# Altium footprint library Package_DFN_QFN.PcbLib: 557 footprints (part 24 of 35)
Each footprint in its own frame and in the unit in brackets; x right, y up, seen from the top. Pads: shape width x height; smd on the part's side, far side on the other; paste and mask are expansions set on the pad; w line width, h text height; cw(c..) or ccw(c..) is an arc to the next point about the centre after c.
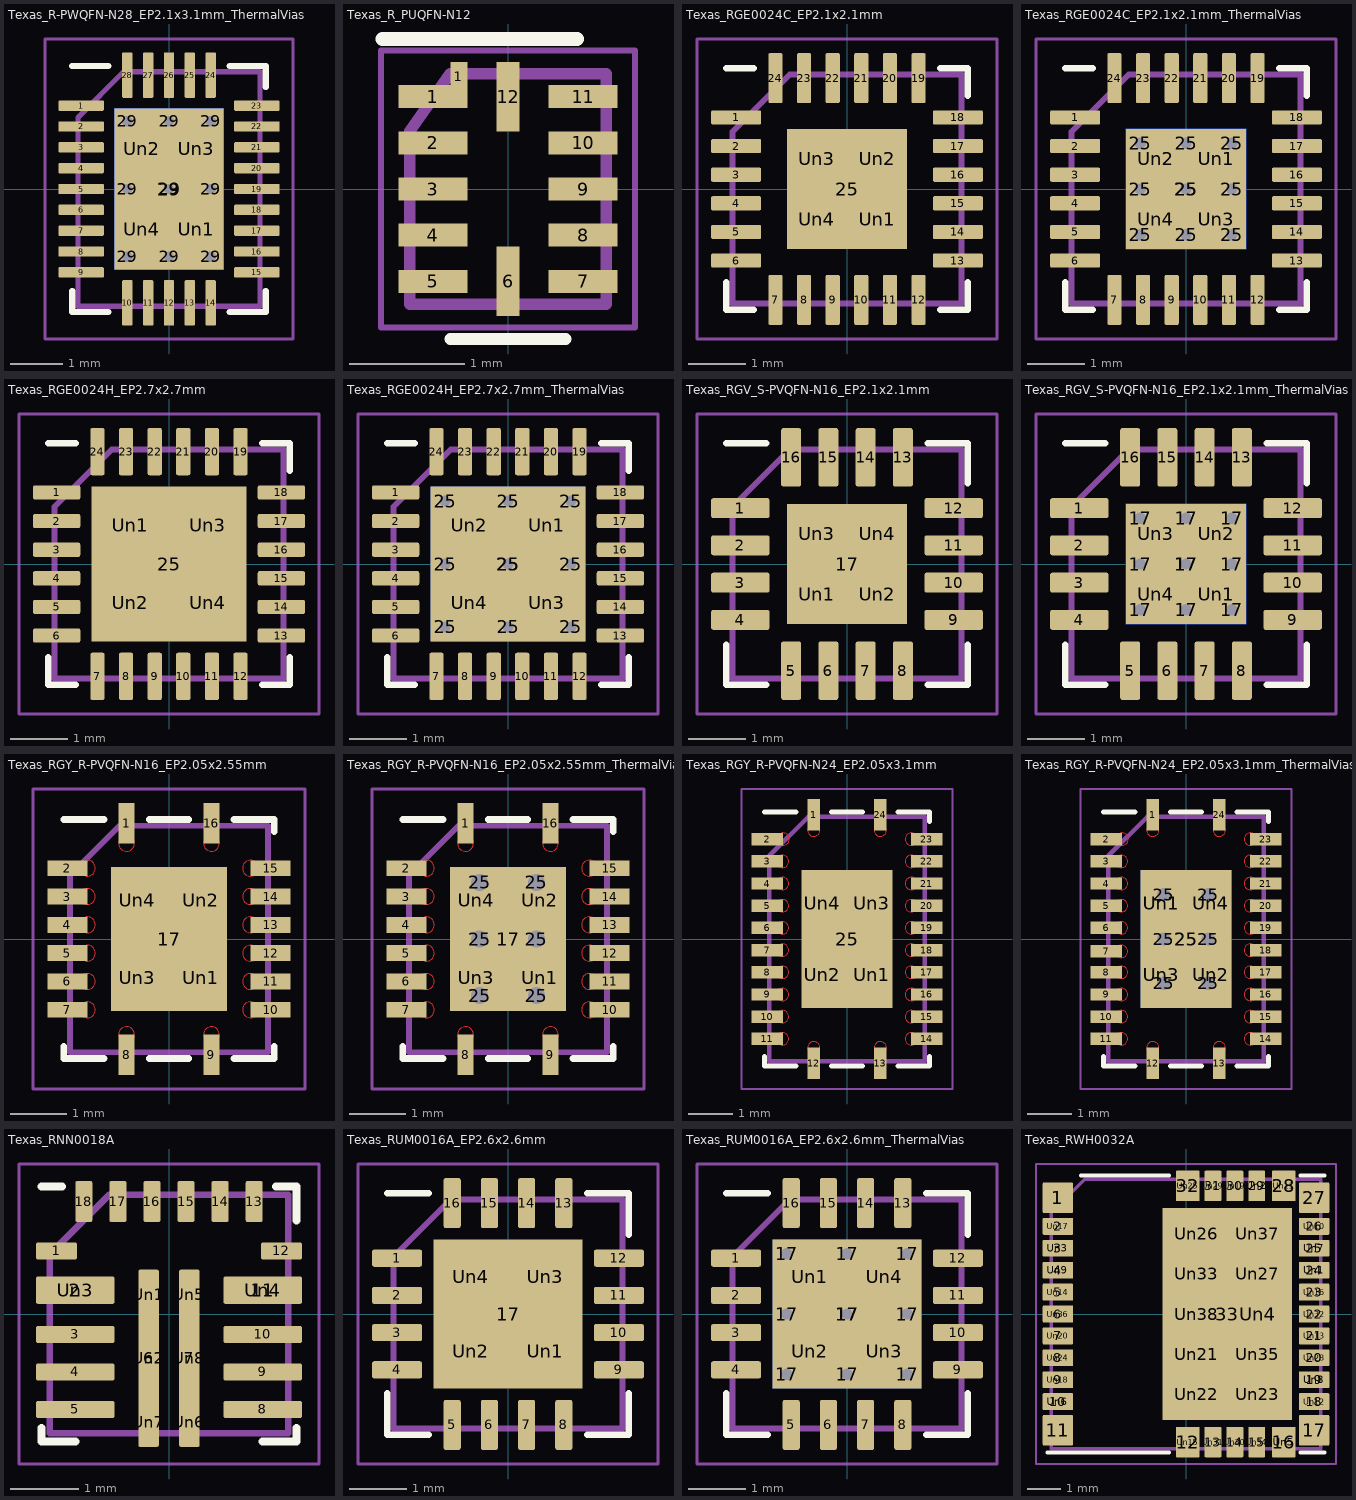
[diagram p23: the footprints below, top view; thin cyan lines are the x and y axes]

## Texas_R-PWQFN-N28_EP2.1x3.1mm_ThermalVias [mm]
pads (43):
  rrect25% 0.875x0.2 smd: 1(-1.687,1.6) 2(-1.687,1.2) 3(-1.687,0.8) 4(-1.687,0.4) 5(-1.687,0) 6(-1.687,-0.4) 7(-1.687,-0.8) 8(-1.687,-1.2) 9(-1.687,-1.6) 15(1.687,-1.6) 16(1.687,-1.2) 17(1.687,-0.8) 18(1.687,-0.4) 19(1.687,0) 20(1.687,0.4) 21(1.687,0.8) 22(1.687,1.2) 23(1.687,1.6)
  rrect25% 0.2x0.875 smd: 10(-0.8,-2.187) 11(-0.4,-2.187) 12(0,-2.187) 13(0.4,-2.187) 14(0.8,-2.187) 24(0.8,2.187) 25(0.4,2.187) 26(0,2.187) 27(-0.4,2.187) 28(-0.8,2.187)
  round 0.5 hole 0.2: 29(-0.8,-1.3) 29(-0.8,0) 29(-0.8,1.3) 29(0,-1.3) 29(0,0) 29(0,1.3) 29(0.8,-1.3) 29(0.8,0) 29(0.8,1.3)
  rect 2.1x3.1 smd: 29(0,0)
  rect 2.1x3.1 smd far side: 29(0,0)
  rrect25% 0.88x1.3 on Top Paste: Un1(0.525,-0.775) Un2(-0.525,0.775) Un3(0.525,0.775) Un4(-0.525,-0.775)
F.SilkS:
  lines w0.12: -1.86,-1.96 -1.86,-2.36 -1.16,-2.36 ; -1.86,2.36 -1.16,2.36 ; 1.16,-2.36 1.86,-2.36 1.86,-1.96 ; 1.16,2.36 1.86,2.36 1.86,1.96
F.CrtYd:
  lines w0.05: -2.38,-2.88 2.38,-2.88 2.38,2.88 -2.38,2.88 -2.38,-2.88
F.Fab:
  lines w0.1: -1.75,-2.25 1.75,-2.25 1.75,2.25 -0.875,2.25 -1.75,1.375 -1.75,-2.25
  text "'.Designator'" at -3.559,-0.737 h0.88

## Texas_R_PUQFN-N12 [mm]
pads (13):
  rect 0.6x0.2 smd: 1(-0.65,0.8) 2(-0.65,0.4) 3(-0.65,0) 4(-0.65,-0.4) 5(-0.65,-0.8) 7(0.65,-0.8) 8(0.65,-0.4) 9(0.65,0) 10(0.65,0.4) 11(0.65,0.8)
  rect 0.15x0.25 smd: 1(-0.425,0.975)
  rect 0.2x0.6 smd: 6(0,-0.8) 12(0,0.8)
F.SilkS:
  lines w0.1: -0.5,-1.3 0.5,-1.3
  lines w0.12: -1.09,1.3 0.6,1.3
F.CrtYd:
  lines w0.05: -1.1,-1.2 -1.1,1.2 1.1,1.2 1.1,-1.2 -1.1,-1.2
F.Fab:
  lines w0.1: -0.85,-1 0.85,-1 0.85,1 -0.5,1 -0.85,0.5 -0.85,-1
  text "'.Designator'" at -1.199,-0.237 h0.3

## Texas_RGE0024C_EP2.1x2.1mm [mm]
pads (29):
  rrect25% 0.875x0.25 smd: 1(-1.937,1.25) 2(-1.937,0.75) 3(-1.937,0.25) 4(-1.937,-0.25) 5(-1.937,-0.75) 6(-1.937,-1.25) 13(1.937,-1.25) 14(1.937,-0.75) 15(1.937,-0.25) 16(1.937,0.25) 17(1.937,0.75) 18(1.937,1.25)
  rrect25% 0.25x0.875 smd: 7(-1.25,-1.937) 8(-0.75,-1.937) 9(-0.25,-1.937) 10(0.25,-1.937) 11(0.75,-1.937) 12(1.25,-1.937) 19(1.25,1.937) 20(0.75,1.937) 21(0.25,1.937) 22(-0.25,1.937) 23(-0.75,1.937) 24(-1.25,1.937)
  rect 2.1x2.1 smd: 25(0,0)
  rrect25% 0.85x0.85 on Top Paste: Un1(0.525,-0.525) Un2(0.525,0.525) Un3(-0.525,0.525) Un4(-0.525,-0.525)
F.SilkS:
  lines w0.12: -2.11,-1.635 -2.11,-2.11 -1.635,-2.11 ; -2.11,2.11 -1.635,2.11 ; 1.635,-2.11 2.11,-2.11 2.11,-1.635 ; 1.635,2.11 2.11,2.11 2.11,1.635
F.CrtYd:
  lines w0.05: -2.62,-2.62 2.62,-2.62 2.62,2.62 -2.62,2.62 -2.62,-2.62
F.Fab:
  lines w0.1: -2,-2 -2,1 -1,2 2,2 2,-2 -2,-2
  text "'.Designator'" at -4.047,-0.84 h1

## Texas_RGE0024C_EP2.1x2.1mm_ThermalVias [mm]
pads (39):
  rrect25% 0.875x0.25 smd: 1(-1.937,1.25) 2(-1.937,0.75) 3(-1.937,0.25) 4(-1.937,-0.25) 5(-1.937,-0.75) 6(-1.937,-1.25) 13(1.937,-1.25) 14(1.937,-0.75) 15(1.937,-0.25) 16(1.937,0.25) 17(1.937,0.75) 18(1.937,1.25)
  rrect25% 0.25x0.875 smd: 7(-1.25,-1.937) 8(-0.75,-1.937) 9(-0.25,-1.937) 10(0.25,-1.937) 11(0.75,-1.937) 12(1.25,-1.937) 19(1.25,1.937) 20(0.75,1.937) 21(0.25,1.937) 22(-0.25,1.937) 23(-0.75,1.937) 24(-1.25,1.937)
  round 0.5 hole 0.2: 25(-0.8,-0.8) 25(-0.8,0) 25(-0.8,0.8) 25(0,-0.8) 25(0,0) 25(0,0.8) 25(0.8,-0.8) 25(0.8,0) 25(0.8,0.8)
  rect 2.1x2.1 smd far side: 25(0,0)
  rect 2.1x2.1 smd: 25(0,0)
  rrect25% 0.85x0.85 on Top Paste: Un1(0.525,0.525) Un2(-0.525,0.525) Un3(0.525,-0.525) Un4(-0.525,-0.525)
F.SilkS:
  lines w0.12: -2.11,-1.635 -2.11,-2.11 -1.635,-2.11 ; -2.11,2.11 -1.635,2.11 ; 1.635,-2.11 2.11,-2.11 2.11,-1.635 ; 1.635,2.11 2.11,2.11 2.11,1.635
F.CrtYd:
  lines w0.05: -2.62,-2.62 -2.62,2.62 2.62,2.62 2.62,-2.62 -2.62,-2.62
F.Fab:
  lines w0.1: -2,-2 -2,1 -1,2 2,2 2,-2 -2,-2
  text "'.Designator'" at -4.047,-0.84 h1

## Texas_RGE0024H_EP2.7x2.7mm [mm]
pads (29):
  rrect25% 0.825x0.25 smd: 1(-1.963,1.25) 2(-1.963,0.75) 3(-1.963,0.25) 4(-1.963,-0.25) 5(-1.963,-0.75) 6(-1.963,-1.25) 13(1.963,-1.25) 14(1.963,-0.75) 15(1.963,-0.25) 16(1.963,0.25) 17(1.963,0.75) 18(1.963,1.25)
  rrect25% 0.25x0.825 smd: 7(-1.25,-1.963) 8(-0.75,-1.963) 9(-0.25,-1.963) 10(0.25,-1.963) 11(0.75,-1.963) 12(1.25,-1.963) 19(1.25,1.963) 20(0.75,1.963) 21(0.25,1.963) 22(-0.25,1.963) 23(-0.75,1.963) 24(-1.25,1.963)
  rect 2.7x2.7 smd: 25(0,0)
  rrect23% 1.09x1.09 on Top Paste: Un1(-0.675,0.675) Un2(-0.675,-0.675) Un3(0.675,0.675) Un4(0.675,-0.675)
F.SilkS:
  lines w0.12: -2.11,-1.635 -2.11,-2.11 -1.635,-2.11 ; -2.11,2.11 -1.635,2.11 ; 1.635,-2.11 2.11,-2.11 2.11,-1.635 ; 1.635,2.11 2.11,2.11 2.11,1.635
F.CrtYd:
  lines w0.05: -2.62,-2.62 -2.62,2.62 2.62,2.62 2.62,-2.62 -2.62,-2.62
F.Fab:
  lines w0.1: -2,-2 2,-2 2,2 -1,2 -2,1 -2,-2
  text "'.Designator'" at -4.047,-0.84 h1

## Texas_RGE0024H_EP2.7x2.7mm_ThermalVias [mm]
pads (39):
  rrect25% 0.825x0.25 smd: 1(-1.963,1.25) 2(-1.963,0.75) 3(-1.963,0.25) 4(-1.963,-0.25) 5(-1.963,-0.75) 6(-1.963,-1.25) 13(1.963,-1.25) 14(1.963,-0.75) 15(1.963,-0.25) 16(1.963,0.25) 17(1.963,0.75) 18(1.963,1.25)
  rrect25% 0.25x0.825 smd: 7(-1.25,-1.963) 8(-0.75,-1.963) 9(-0.25,-1.963) 10(0.25,-1.963) 11(0.75,-1.963) 12(1.25,-1.963) 19(1.25,1.963) 20(0.75,1.963) 21(0.25,1.963) 22(-0.25,1.963) 23(-0.75,1.963) 24(-1.25,1.963)
  round 0.5 hole 0.2: 25(-1.1,-1.1) 25(-1.1,0) 25(-1.1,1.1) 25(0,-1.1) 25(0,0) 25(0,1.1) 25(1.1,-1.1) 25(1.1,0) 25(1.1,1.1)
  rect 2.7x2.7 smd far side: 25(0,0)
  rect 2.7x2.7 smd: 25(0,0)
  rrect21% 1.17x1.17 on Top Paste: Un1(0.675,0.675) Un2(-0.675,0.675) Un3(0.675,-0.675) Un4(-0.675,-0.675)
F.SilkS:
  lines w0.12: -2.11,-1.635 -2.11,-2.11 -1.635,-2.11 ; -2.11,2.11 -1.635,2.11 ; 1.635,-2.11 2.11,-2.11 2.11,-1.635 ; 1.635,2.11 2.11,2.11 2.11,1.635
F.CrtYd:
  lines w0.05: -2.62,-2.62 2.62,-2.62 2.62,2.62 -2.62,2.62 -2.62,-2.62
F.Fab:
  lines w0.1: -2,-2 2,-2 2,2 -1,2 -2,1 -2,-2
  text "'.Designator'" at -4.047,-0.84 h1

## Texas_RGV_S-PVQFN-N16_EP2.1x2.1mm [mm]
pads (21):
  rrect25% 1.025x0.35 smd: 1(-1.863,0.975) 2(-1.863,0.325) 3(-1.863,-0.325) 4(-1.863,-0.975) 9(1.863,-0.975) 10(1.863,-0.325) 11(1.863,0.325) 12(1.863,0.975)
  rrect25% 0.35x1.025 smd: 5(-0.975,-1.863) 6(-0.325,-1.863) 7(0.325,-1.863) 8(0.975,-1.863) 13(0.975,1.863) 14(0.325,1.863) 15(-0.325,1.863) 16(-0.975,1.863)
  rect 2.1x2.1 smd: 17(0,0)
  rrect25% 0.85x0.85 on Top Paste: Un1(-0.525,-0.525) Un2(0.525,-0.525) Un3(-0.525,0.525) Un4(0.525,0.525)
F.SilkS:
  lines w0.12: -2.11,-1.41 -2.11,-2.11 -1.41,-2.11 ; -2.11,2.11 -1.41,2.11 ; 1.41,-2.11 2.11,-2.11 2.11,-1.41 ; 1.41,2.11 2.11,2.11 2.11,1.41
F.CrtYd:
  lines w0.05: -2.62,-2.62 -2.62,2.62 2.62,2.62 2.62,-2.62 -2.62,-2.62
F.Fab:
  lines w0.1: -2,-2 2,-2 2,2 -1,2 -2,1 -2,-2
  text "'.Designator'" at -4.047,-0.84 h1

## Texas_RGV_S-PVQFN-N16_EP2.1x2.1mm_ThermalVias [mm]
pads (31):
  rrect25% 1.025x0.35 smd: 1(-1.863,0.975) 2(-1.863,0.325) 3(-1.863,-0.325) 4(-1.863,-0.975) 9(1.863,-0.975) 10(1.863,-0.325) 11(1.863,0.325) 12(1.863,0.975)
  rrect25% 0.35x1.025 smd: 5(-0.975,-1.863) 6(-0.325,-1.863) 7(0.325,-1.863) 8(0.975,-1.863) 13(0.975,1.863) 14(0.325,1.863) 15(-0.325,1.863) 16(-0.975,1.863)
  round 0.5 hole 0.2: 17(-0.8,-0.8) 17(-0.8,0) 17(-0.8,0.8) 17(0,-0.8) 17(0,0) 17(0,0.8) 17(0.8,-0.8) 17(0.8,0) 17(0.8,0.8)
  rect 2.1x2.1 smd: 17(0,0)
  rect 2.1x2.1 smd far side: 17(0,0)
  rrect25% 0.91x0.91 on Top Paste: Un1(0.525,-0.525) Un2(0.525,0.525) Un3(-0.525,0.525) Un4(-0.525,-0.525)
F.SilkS:
  lines w0.12: -2.11,-1.41 -2.11,-2.11 -1.41,-2.11 ; -2.11,2.11 -1.41,2.11 ; 1.41,-2.11 2.11,-2.11 2.11,-1.41 ; 1.41,2.11 2.11,2.11 2.11,1.41
F.CrtYd:
  lines w0.05: -2.62,-2.62 -2.62,2.62 2.62,2.62 2.62,-2.62 -2.62,-2.62
F.Fab:
  lines w0.1: -2,-2 -2,1 -1,2 2,2 2,-2 -2,-2
  text "'.Designator'" at -4.047,-0.84 h1

## Texas_RGY_R-PVQFN-N16_EP2.05x2.55mm [mm]
pads (21):
  rect 0.28x0.71 smd: 1(-0.75,2.045) 8(-0.75,-2.045) 9(0.75,-2.045) 16(0.75,2.045)
  rect 0.71x0.28 smd: 2(-1.795,1.25) 3(-1.795,0.75) 4(-1.795,0.25) 5(-1.795,-0.25) 6(-1.795,-0.75) 7(-1.795,-1.25) 10(1.795,-1.25) 11(1.795,-0.75) 12(1.795,-0.25) 13(1.795,0.25) 14(1.795,0.75) 15(1.795,1.25)
  rect 2.05x2.55 smd: 17(0,0)
  rect 0.82x1.07 on Top Paste: Un1(0.56,-0.685) Un2(0.56,0.685) Un3(-0.56,-0.685) Un4(-0.56,0.685)
F.Cu:
  circle w0: c-0.75,1.69 r0.14
  circle w0: c-1.44,1.25 r0.14
  circle w0: c-1.44,0.75 r0.14
  circle w0: c-1.44,0.25 r0.14
  circle w0: c-1.44,-0.25 r0.14
  circle w0: c-1.44,-0.75 r0.14
  circle w0: c-1.44,-1.25 r0.14
  circle w0: c-0.75,-1.69 r0.14
  circle w0: c0.75,-1.69 r0.14
  circle w0: c1.44,-1.25 r0.14
  circle w0: c1.44,-0.75 r0.14
  circle w0: c1.44,-0.25 r0.14
  circle w0: c1.44,0.25 r0.14
  circle w0: c1.44,0.75 r0.14
  circle w0: c1.44,1.25 r0.14
  circle w0: c0.75,1.69 r0.14
F.SilkS:
  lines w0.12: -1.86,-1.9 -1.86,-2.11 -1.15,-2.11 ; -1.86,2.11 -1.15,2.11 ; -0.35,-2.11 0.35,-2.11 ; -0.35,2.11 0.35,2.11 ; 1.15,-2.11 1.86,-2.11 1.86,-1.9 ; 1.15,2.11 1.86,2.11 1.86,1.9
F.Paste:
  circle w0: c-0.75,1.69 r0.14
  circle w0: c-1.44,1.25 r0.14
  circle w0: c-1.44,0.75 r0.14
  circle w0: c-1.44,0.25 r0.14
  circle w0: c-1.44,-0.25 r0.14
  circle w0: c-1.44,-0.75 r0.14
  circle w0: c-1.44,-1.25 r0.14
  circle w0: c-0.75,-1.69 r0.14
  circle w0: c0.75,-1.69 r0.14
  circle w0: c1.44,-1.25 r0.14
  circle w0: c1.44,-0.75 r0.14
  circle w0: c1.44,-0.25 r0.14
  circle w0: c1.44,0.25 r0.14
  circle w0: c1.44,0.75 r0.14
  circle w0: c1.44,1.25 r0.14
  circle w0: c0.75,1.69 r0.14
F.Mask:
  circle w0: c-0.75,1.69 r0.14
  circle w0: c-1.44,1.25 r0.14
  circle w0: c-1.44,0.75 r0.14
  circle w0: c-1.44,0.25 r0.14
  circle w0: c-1.44,-0.25 r0.14
  circle w0: c-1.44,-0.75 r0.14
  circle w0: c-1.44,-1.25 r0.14
  circle w0: c-0.75,-1.69 r0.14
  circle w0: c0.75,-1.69 r0.14
  circle w0: c1.44,-1.25 r0.14
  circle w0: c1.44,-0.75 r0.14
  circle w0: c1.44,-0.25 r0.14
  circle w0: c1.44,0.25 r0.14
  circle w0: c1.44,0.75 r0.14
  circle w0: c1.44,1.25 r0.14
  circle w0: c0.75,1.69 r0.14
F.CrtYd:
  lines w0.05: -2.4,-2.65 2.4,-2.65 2.4,2.65 -2.4,2.65 -2.4,-2.65
F.Fab:
  lines w0.1: -1.75,-2 -1.75,1.125 -0.875,2 1.75,2 1.75,-2 -1.75,-2
  text "'.Designator'" at -3.559,-0.737 h0.88

## Texas_RGY_R-PVQFN-N16_EP2.05x2.55mm_ThermalVias [mm]
pads (27):
  rect 0.28x0.71 smd: 1(-0.75,2.045) 8(-0.75,-2.045) 9(0.75,-2.045) 16(0.75,2.045)
  rect 0.71x0.28 smd: 2(-1.795,1.25) 3(-1.795,0.75) 4(-1.795,0.25) 5(-1.795,-0.25) 6(-1.795,-0.75) 7(-1.795,-1.25) 10(1.795,-1.25) 11(1.795,-0.75) 12(1.795,-0.25) 13(1.795,0.25) 14(1.795,0.75) 15(1.795,1.25)
  rect 2.05x2.55 smd: 17(0,0)
  round 0.5 hole 0.3: 25(-0.5,-1) 25(-0.5,0) 25(-0.5,1) 25(0.5,-1) 25(0.5,0) 25(0.5,1)
  rect 0.82x1.07 on Top Paste: Un1(0.56,-0.685) Un2(0.56,0.685) Un3(-0.56,-0.685) Un4(-0.56,0.685)
F.Cu:
  circle w0: c-0.75,1.69 r0.14
  circle w0: c-1.44,1.25 r0.14
  circle w0: c-1.44,0.75 r0.14
  circle w0: c-1.44,0.25 r0.14
  circle w0: c-1.44,-0.25 r0.14
  circle w0: c-1.44,-0.75 r0.14
  circle w0: c-1.44,-1.25 r0.14
  circle w0: c-0.75,-1.69 r0.14
  circle w0: c0.75,-1.69 r0.14
  circle w0: c1.44,-1.25 r0.14
  circle w0: c1.44,-0.75 r0.14
  circle w0: c1.44,-0.25 r0.14
  circle w0: c1.44,0.25 r0.14
  circle w0: c1.44,0.75 r0.14
  circle w0: c1.44,1.25 r0.14
  circle w0: c0.75,1.69 r0.14
F.SilkS:
  lines w0.12: -1.86,-1.9 -1.86,-2.11 -1.15,-2.11 ; -1.86,2.11 -1.15,2.11 ; -0.35,-2.11 0.35,-2.11 ; -0.35,2.11 0.35,2.11 ; 1.15,-2.11 1.86,-2.11 1.86,-1.9 ; 1.15,2.11 1.86,2.11 1.86,1.9
F.Paste:
  circle w0: c-0.75,1.69 r0.14
  circle w0: c-1.44,1.25 r0.14
  circle w0: c-1.44,0.75 r0.14
  circle w0: c-1.44,0.25 r0.14
  circle w0: c-1.44,-0.25 r0.14
  circle w0: c-1.44,-0.75 r0.14
  circle w0: c-1.44,-1.25 r0.14
  circle w0: c-0.75,-1.69 r0.14
  circle w0: c0.75,-1.69 r0.14
  circle w0: c1.44,-1.25 r0.14
  circle w0: c1.44,-0.75 r0.14
  circle w0: c1.44,-0.25 r0.14
  circle w0: c1.44,0.25 r0.14
  circle w0: c1.44,0.75 r0.14
  circle w0: c1.44,1.25 r0.14
  circle w0: c0.75,1.69 r0.14
F.Mask:
  circle w0: c-0.75,1.69 r0.14
  circle w0: c-1.44,1.25 r0.14
  circle w0: c-1.44,0.75 r0.14
  circle w0: c-1.44,0.25 r0.14
  circle w0: c-1.44,-0.25 r0.14
  circle w0: c-1.44,-0.75 r0.14
  circle w0: c-1.44,-1.25 r0.14
  circle w0: c-0.75,-1.69 r0.14
  circle w0: c0.75,-1.69 r0.14
  circle w0: c1.44,-1.25 r0.14
  circle w0: c1.44,-0.75 r0.14
  circle w0: c1.44,-0.25 r0.14
  circle w0: c1.44,0.25 r0.14
  circle w0: c1.44,0.75 r0.14
  circle w0: c1.44,1.25 r0.14
  circle w0: c0.75,1.69 r0.14
F.CrtYd:
  lines w0.05: -2.4,-2.65 2.4,-2.65 2.4,2.65 -2.4,2.65 -2.4,-2.65
F.Fab:
  lines w0.1: -1.75,-2 -1.75,1.125 -0.875,2 1.75,2 1.75,-2 -1.75,-2
  text "'.Designator'" at -3.559,-0.737 h0.88

## Texas_RGY_R-PVQFN-N24_EP2.05x3.1mm [mm]
pads (29):
  rect 0.28x0.71 smd: 1(-0.75,2.795) 12(-0.75,-2.795) 13(0.75,-2.795) 24(0.75,2.795)
  rect 0.71x0.28 smd: 2(-1.795,2.25) 3(-1.795,1.75) 4(-1.795,1.25) 5(-1.795,0.75) 6(-1.795,0.25) 7(-1.795,-0.25) 8(-1.795,-0.75) 9(-1.795,-1.25) 10(-1.795,-1.75) 11(-1.795,-2.25) 14(1.795,-2.25) 15(1.795,-1.75) 16(1.795,-1.25) 17(1.795,-0.75) 18(1.795,-0.25) 19(1.795,0.25) 20(1.795,0.75) 21(1.795,1.25) 22(1.795,1.75) 23(1.795,2.25)
  rect 2.05x3.1 smd: 25(0,0)
  rect 0.82x1.32 on Top Paste: Un1(0.56,-0.81) Un2(-0.56,-0.81) Un3(0.56,0.81) Un4(-0.56,0.81)
F.Cu:
  circle w0: c-0.75,2.452 r0.14
  circle w0: c-1.44,2.25 r0.14
  circle w0: c-1.452,1.75 r0.14
  circle w0: c-1.452,1.25 r0.14
  circle w0: c-1.452,0.75 r0.14
  circle w0: c-1.452,0.25 r0.14
  circle w0: c-1.452,-0.25 r0.14
  circle w0: c-1.452,-0.75 r0.14
  circle w0: c-1.452,-1.25 r0.14
  circle w0: c-1.452,-1.75 r0.14
  circle w0: c-1.452,-2.25 r0.14
  circle w0: c-0.75,-2.452 r0.14
  circle w0: c0.75,-2.452 r0.14
  circle w0: c1.452,-2.25 r0.14
  circle w0: c1.452,-1.75 r0.14
  circle w0: c1.452,-1.25 r0.14
  circle w0: c1.452,-0.75 r0.14
  circle w0: c1.452,-0.25 r0.14
  circle w0: c1.452,0.25 r0.14
  circle w0: c1.452,0.75 r0.14
  circle w0: c1.452,1.25 r0.14
  circle w0: c1.452,1.75 r0.14
  circle w0: c1.452,2.25 r0.14
  circle w0: c0.75,2.452 r0.14
F.SilkS:
  lines w0.12: -1.86,-2.65 -1.86,-2.86 -1.15,-2.86 ; -1.86,2.86 -1.15,2.86 ; -0.35,-2.86 0.35,-2.86 ; -0.35,2.86 0.35,2.86 ; 1.15,-2.86 1.86,-2.86 1.86,-2.65 ; 1.15,2.86 1.86,2.86 1.86,2.65
F.Paste:
  circle w0: c-0.75,2.452 r0.14
  circle w0: c-1.44,2.25 r0.14
  circle w0: c-1.452,1.75 r0.14
  circle w0: c-1.452,1.25 r0.14
  circle w0: c-1.452,0.75 r0.14
  circle w0: c-1.452,0.25 r0.14
  circle w0: c-1.452,-0.25 r0.14
  circle w0: c-1.452,-0.75 r0.14
  circle w0: c-1.452,-1.25 r0.14
  circle w0: c-1.452,-1.75 r0.14
  circle w0: c-1.452,-2.25 r0.14
  circle w0: c-0.75,-2.452 r0.14
  circle w0: c0.75,-2.452 r0.14
  circle w0: c1.452,-2.25 r0.14
  circle w0: c1.452,-1.75 r0.14
  circle w0: c1.452,-1.25 r0.14
  circle w0: c1.452,-0.75 r0.14
  circle w0: c1.452,-0.25 r0.14
  circle w0: c1.452,0.25 r0.14
  circle w0: c1.452,0.75 r0.14
  circle w0: c1.452,1.25 r0.14
  circle w0: c1.452,1.75 r0.14
  circle w0: c1.452,2.25 r0.14
  circle w0: c0.75,2.452 r0.14
F.Mask:
  circle w0: c-0.75,2.452 r0.14
  circle w0: c-1.44,2.25 r0.14
  circle w0: c-1.452,1.75 r0.14
  circle w0: c-1.452,1.25 r0.14
  circle w0: c-1.452,0.75 r0.14
  circle w0: c-1.452,0.25 r0.14
  circle w0: c-1.452,-0.25 r0.14
  circle w0: c-1.452,-0.75 r0.14
  circle w0: c-1.452,-1.25 r0.14
  circle w0: c-1.452,-1.75 r0.14
  circle w0: c-1.452,-2.25 r0.14
  circle w0: c-0.75,-2.452 r0.14
  circle w0: c0.75,-2.452 r0.14
  circle w0: c1.452,-2.25 r0.14
  circle w0: c1.452,-1.75 r0.14
  circle w0: c1.452,-1.25 r0.14
  circle w0: c1.452,-0.75 r0.14
  circle w0: c1.452,-0.25 r0.14
  circle w0: c1.452,0.25 r0.14
  circle w0: c1.452,0.75 r0.14
  circle w0: c1.452,1.25 r0.14
  circle w0: c1.452,1.75 r0.14
  circle w0: c1.452,2.25 r0.14
  circle w0: c0.75,2.452 r0.14
F.CrtYd:
  lines w0.05: -2.38,-3.38 -2.38,3.38 2.38,3.38 2.38,-3.38 -2.38,-3.38
F.Fab:
  lines w0.1: -1.75,-2.75 -1.75,1.875 -0.875,2.75 1.75,2.75 1.75,-2.75 -1.75,-2.75
  text "'.Designator'" at -3.559,-0.737 h0.88

## Texas_RGY_R-PVQFN-N24_EP2.05x3.1mm_ThermalVias [mm]
pads (36):
  rect 0.28x0.71 smd: 1(-0.75,2.795) 12(-0.75,-2.795) 13(0.75,-2.795) 24(0.75,2.795)
  rect 0.71x0.28 smd: 2(-1.795,2.25) 3(-1.795,1.75) 4(-1.795,1.25) 5(-1.795,0.75) 6(-1.795,0.25) 7(-1.795,-0.28) 8(-1.795,-0.75) 9(-1.795,-1.25) 10(-1.795,-1.75) 11(-1.795,-2.25) 14(1.795,-2.25) 15(1.795,-1.75) 16(1.795,-1.25) 17(1.795,-0.75) 18(1.795,-0.25) 19(1.795,0.25) 20(1.795,0.75) 21(1.795,1.25) 22(1.795,1.75) 23(1.795,2.25)
  round 0.6 hole 0.3: 25(-0.5,-1) 25(-0.5,0) 25(-0.5,1) 25(0.5,-1) 25(0.5,0) 25(0.5,1)
  rect 2.05x3.1 smd: 25(0,0)
  rect 2.05x3.1 smd far side: 25(0,0)
  rect 0.82x1.32 on Top Paste: Un1(-0.56,0.81) Un2(0.56,-0.81) Un3(-0.56,-0.81) Un4(0.56,0.81)
F.Cu:
  circle w0: c-0.75,2.452 r0.14
  circle w0: c-1.44,2.25 r0.14
  circle w0: c-1.452,1.75 r0.14
  circle w0: c-1.452,1.25 r0.14
  circle w0: c-1.452,0.75 r0.14
  circle w0: c-1.452,0.25 r0.14
  circle w0: c-1.452,-0.28 r0.14
  circle w0: c-1.452,-0.75 r0.14
  circle w0: c-1.452,-1.25 r0.14
  circle w0: c-1.452,-1.75 r0.14
  circle w0: c-1.452,-2.25 r0.14
  circle w0: c-0.75,-2.452 r0.14
  circle w0: c0.75,-2.452 r0.14
  circle w0: c1.452,-2.25 r0.14
  circle w0: c1.452,-1.75 r0.14
  circle w0: c1.452,-1.25 r0.14
  circle w0: c1.452,-0.75 r0.14
  circle w0: c1.452,-0.25 r0.14
  circle w0: c1.452,0.25 r0.14
  circle w0: c1.452,0.75 r0.14
  circle w0: c1.452,1.25 r0.14
  circle w0: c1.452,1.75 r0.14
  circle w0: c1.452,2.25 r0.14
  circle w0: c0.75,2.452 r0.14
F.SilkS:
  lines w0.12: -1.86,-2.65 -1.86,-2.86 -1.15,-2.86 ; -1.86,2.86 -1.15,2.86 ; -0.35,-2.86 0.35,-2.86 ; -0.35,2.86 0.35,2.86 ; 1.15,-2.86 1.86,-2.86 1.86,-2.65 ; 1.15,2.86 1.86,2.86 1.86,2.65
F.Paste:
  circle w0: c-0.75,2.452 r0.14
  circle w0: c-1.44,2.25 r0.14
  circle w0: c-1.452,1.75 r0.14
  circle w0: c-1.452,1.25 r0.14
  circle w0: c-1.452,0.75 r0.14
  circle w0: c-1.452,0.25 r0.14
  circle w0: c-1.452,-0.28 r0.14
  circle w0: c-1.452,-0.75 r0.14
  circle w0: c-1.452,-1.25 r0.14
  circle w0: c-1.452,-1.75 r0.14
  circle w0: c-1.452,-2.25 r0.14
  circle w0: c-0.75,-2.452 r0.14
  circle w0: c0.75,-2.452 r0.14
  circle w0: c1.452,-2.25 r0.14
  circle w0: c1.452,-1.75 r0.14
  circle w0: c1.452,-1.25 r0.14
  circle w0: c1.452,-0.75 r0.14
  circle w0: c1.452,-0.25 r0.14
  circle w0: c1.452,0.25 r0.14
  circle w0: c1.452,0.75 r0.14
  circle w0: c1.452,1.25 r0.14
  circle w0: c1.452,1.75 r0.14
  circle w0: c1.452,2.25 r0.14
  circle w0: c0.75,2.452 r0.14
F.Mask:
  circle w0: c-0.75,2.452 r0.14
  circle w0: c-1.44,2.25 r0.14
  circle w0: c-1.452,1.75 r0.14
  circle w0: c-1.452,1.25 r0.14
  circle w0: c-1.452,0.75 r0.14
  circle w0: c-1.452,0.25 r0.14
  circle w0: c-1.452,-0.28 r0.14
  circle w0: c-1.452,-0.75 r0.14
  circle w0: c-1.452,-1.25 r0.14
  circle w0: c-1.452,-1.75 r0.14
  circle w0: c-1.452,-2.25 r0.14
  circle w0: c-0.75,-2.452 r0.14
  circle w0: c0.75,-2.452 r0.14
  circle w0: c1.452,-2.25 r0.14
  circle w0: c1.452,-1.75 r0.14
  circle w0: c1.452,-1.25 r0.14
  circle w0: c1.452,-0.75 r0.14
  circle w0: c1.452,-0.25 r0.14
  circle w0: c1.452,0.25 r0.14
  circle w0: c1.452,0.75 r0.14
  circle w0: c1.452,1.25 r0.14
  circle w0: c1.452,1.75 r0.14
  circle w0: c1.452,2.25 r0.14
  circle w0: c0.75,2.452 r0.14
F.CrtYd:
  lines w0.05: -2.38,-3.38 -2.38,3.38 2.38,3.38 2.38,-3.38 -2.38,-3.38
F.Fab:
  lines w0.1: -1.75,-2.75 1.75,-2.75 1.75,2.75 -0.875,2.75 -1.75,1.875 -1.75,-2.75
  text "'.Designator'" at -3.559,-0.737 h0.88

## Texas_RNN0018A [mm]
pads (26):
  rrect20% 0.6x0.25 smd: 1(-1.65,0.925) 12(1.65,0.925)
  rrect12% 1.15x0.4 smd: 2(-1.375,0.35) 11(1.375,0.35)
  rrect20% 1.15x0.25 smd: 3(-1.375,-0.3) 4(-1.375,-0.85) 5(-1.375,-1.4) 8(1.375,-1.4) 9(1.375,-0.85) 10(1.375,-0.3)
  rrect17% 0.3x2.6 smd: 6(-0.3,-0.65) 7(0.3,-0.65)
  rrect20% 0.25x0.6 smd: 13(1.25,1.65) 14(0.75,1.65) 15(0.25,1.65) 16(-0.25,1.65) 17(-0.75,1.65) 18(-1.25,1.65)
  rrect17% 0.3x0.733 on Top Paste: Un1(-0.3,0.282) Un2(-0.3,-0.651) Un5(0.3,0.282) Un6(0.3,-1.585) Un7(-0.3,-1.585) Un8(0.3,-0.651)
  rrect14% 1.15x0.36 on Top Paste: Un3(-1.375,0.35) Un4(1.375,0.35)
F.SilkS:
  lines w0.12: -1.87,-1.67 -1.87,-1.87 -1.37,-1.87 ; -1.87,1.87 -1.57,1.87 ; 1.37,-1.87 1.87,-1.87 1.87,-1.67 ; 1.57,1.87 1.87,1.87 1.87,1.37
F.CrtYd:
  lines w0.05: -2.2,-2.2 2.2,-2.2 2.2,2.2 -2.2,2.2 -2.2,-2.2
F.Fab:
  lines w0.1: -1.75,-1.75 -1.75,0.875 -0.875,1.75 1.75,1.75 1.75,-1.75 -1.75,-1.75
  text "'.Designator'" at -3.267,-0.702 h0.8

## Texas_RUM0016A_EP2.6x2.6mm [mm]
pads (21):
  rrect25% 0.875x0.3 smd: 1(-1.937,0.975) 2(-1.937,0.325) 3(-1.937,-0.325) 4(-1.937,-0.975) 9(1.937,-0.975) 10(1.937,-0.325) 11(1.937,0.325) 12(1.937,0.975)
  rrect25% 0.3x0.875 smd: 5(-0.975,-1.937) 6(-0.325,-1.937) 7(0.325,-1.937) 8(0.975,-1.937) 13(0.975,1.937) 14(0.325,1.937) 15(-0.325,1.937) 16(-0.975,1.937)
  rect 2.6x2.6 smd: 17(0,0)
  rrect24% 1.05x1.05 on Top Paste: Un1(0.65,-0.65) Un2(-0.65,-0.65) Un3(0.65,0.65) Un4(-0.65,0.65)
F.SilkS:
  lines w0.12: -2.11,-1.385 -2.11,-2.11 -1.385,-2.11 ; -2.11,2.11 -1.385,2.11 ; 1.385,-2.11 2.11,-2.11 2.11,-1.385 ; 1.385,2.11 2.11,2.11 2.11,1.385
F.CrtYd:
  lines w0.05: -2.62,-2.62 2.62,-2.62 2.62,2.62 -2.62,2.62 -2.62,-2.62
F.Fab:
  lines w0.1: -2,-2 2,-2 2,2 -1,2 -2,1 -2,-2
  text "'.Designator'" at -4.047,-0.84 h1

## Texas_RUM0016A_EP2.6x2.6mm_ThermalVias [mm]
pads (31):
  rrect25% 0.875x0.3 smd: 1(-1.937,0.975) 2(-1.937,0.325) 3(-1.937,-0.325) 4(-1.937,-0.975) 9(1.937,-0.975) 10(1.937,-0.325) 11(1.937,0.325) 12(1.937,0.975)
  rrect25% 0.3x0.875 smd: 5(-0.975,-1.937) 6(-0.325,-1.937) 7(0.325,-1.937) 8(0.975,-1.937) 13(0.975,1.937) 14(0.325,1.937) 15(-0.325,1.937) 16(-0.975,1.937)
  round 0.5 hole 0.2: 17(-1.05,-1.05) 17(-1.05,0) 17(-1.05,1.05) 17(0,-1.05) 17(0,0) 17(0,1.05) 17(1.05,-1.05) 17(1.05,0) 17(1.05,1.05)
  rect 2.6x2.6 smd: 17(0,0)
  rect 2.6x2.6 smd far side: 17(0,0)
  rrect23% 1.09x1.09 on Top Paste: Un1(-0.65,0.65) Un2(-0.65,-0.65) Un3(0.65,-0.65) Un4(0.65,0.65)
F.SilkS:
  lines w0.12: -2.11,-1.385 -2.11,-2.11 -1.385,-2.11 ; -2.11,2.11 -1.385,2.11 ; 1.385,-2.11 2.11,-2.11 2.11,-1.385 ; 1.385,2.11 2.11,2.11 2.11,1.385
F.CrtYd:
  lines w0.05: -2.62,-2.62 2.62,-2.62 2.62,2.62 -2.62,2.62 -2.62,-2.62
F.Fab:
  lines w0.1: -2,-2 -2,1 -1,2 2,2 2,-2 -2,-2
  text "'.Designator'" at -4.047,-0.84 h1

## Texas_RWH0032A [mm]
pads (71):
  rrect6% 0.9x0.9 smd: 1(-3.8,3.45) 11(-3.8,-3.45) 17(3.8,-3.45) 27(3.8,3.45)
  rrect10% 0.9x0.5 smd: 2(-3.8,2.6) 3(-3.8,1.95) 4(-3.8,1.3) 5(-3.8,0.65) 6(-3.8,0) 7(-3.8,-0.65) 8(-3.8,-1.3) 9(-3.8,-1.95) 10(-3.8,-2.6) 18(3.8,-2.6) 19(3.8,-1.95) 20(3.8,-1.3) 21(3.8,-0.65) 22(3.8,0) 23(3.8,0.65) 24(3.8,1.3) 25(3.8,1.95) 26(3.8,2.6)
  rrect7% 0.7x0.9 smd: 12(0.05,-3.8) 16(2.9,-3.8) 28(2.9,3.8) 32(0.05,3.8)
  rrect10% 0.5x0.9 smd: 13(0.8,-3.8) 14(1.45,-3.8) 15(2.1,-3.8) 29(2.1,3.8) 30(1.45,3.8) 31(0.8,3.8)
  rrect1% 3.85x6.3 smd: 33(1.225,0)
  rrect12% 0.76x0.4 on Top Paste: Un1(3.8,1.3) Un3(-3.8,1.95) Un6(-3.8,-2.6) Un7(3.8,1.95) Un8(3.8,-1.95) Un9(-3.8,1.3) Un10(3.8,2.6) Un12(3.8,-2.6) Un13(3.8,-0.65) Un14(-3.8,0.65) Un16(3.8,0.65) Un17(-3.8,2.6) Un18(-3.8,-1.95) Un20(-3.8,-0.65) Un24(-3.8,-1.3) Un28(3.8,-1.3) Un32(3.8,0) Un36(-3.8,0)
  rrect12% 0.4x0.76 on Top Paste: Un2(2.1,3.8) Un19(1.45,3.8) Un29(0.8,3.8) Un30(1.45,-3.8) Un31(0.8,-3.8) Un34(2.1,-3.8)
  rrect5% 1.6x0.99 on Top Paste: Un4(2.125,0) Un21(0.325,-1.19) Un22(0.325,-2.38) Un23(2.125,-2.38) Un26(0.325,2.38) Un27(2.125,1.19) Un33(0.325,1.19) Un35(2.125,-1.19) Un37(2.125,2.38) Un38(0.325,0)
  rrect8% 0.6x0.76 on Top Paste: Un5(2.9,-3.8) Un11(2.9,3.8) Un15(0.05,-3.8) Un25(0.05,3.8)
F.SilkS:
  lines w0.12: -4.11,-4.11 -0.5,-4.11 ; -3.11,4.11 -0.5,4.11 ; 3.4,-4.11 4.11,-4.11 ; 3.4,4.11 4.11,4.11
F.CrtYd:
  lines w0.05: -4.45,-4.45 4.45,-4.45 4.45,4.45 -4.45,4.45 -4.45,-4.45
F.Fab:
  lines w0.1: -4,-4 -4,3 -3,4 4,4 4,-4 -4,-4
  text "'.Designator'" at -4.047,-0.84 h1